# Altium footprint library Phoenix.PcbLib: 25 footprints (part 1 of 2)
Each footprint in its own frame and in the unit in brackets; x right, y up, seen from the top. Pads: shape width x height; smd on the part's side, far side on the other; paste and mask are expansions set on the pad; w line width, h text height; cw(c..) or ccw(c..) is an arc to the next point about the centre after c.
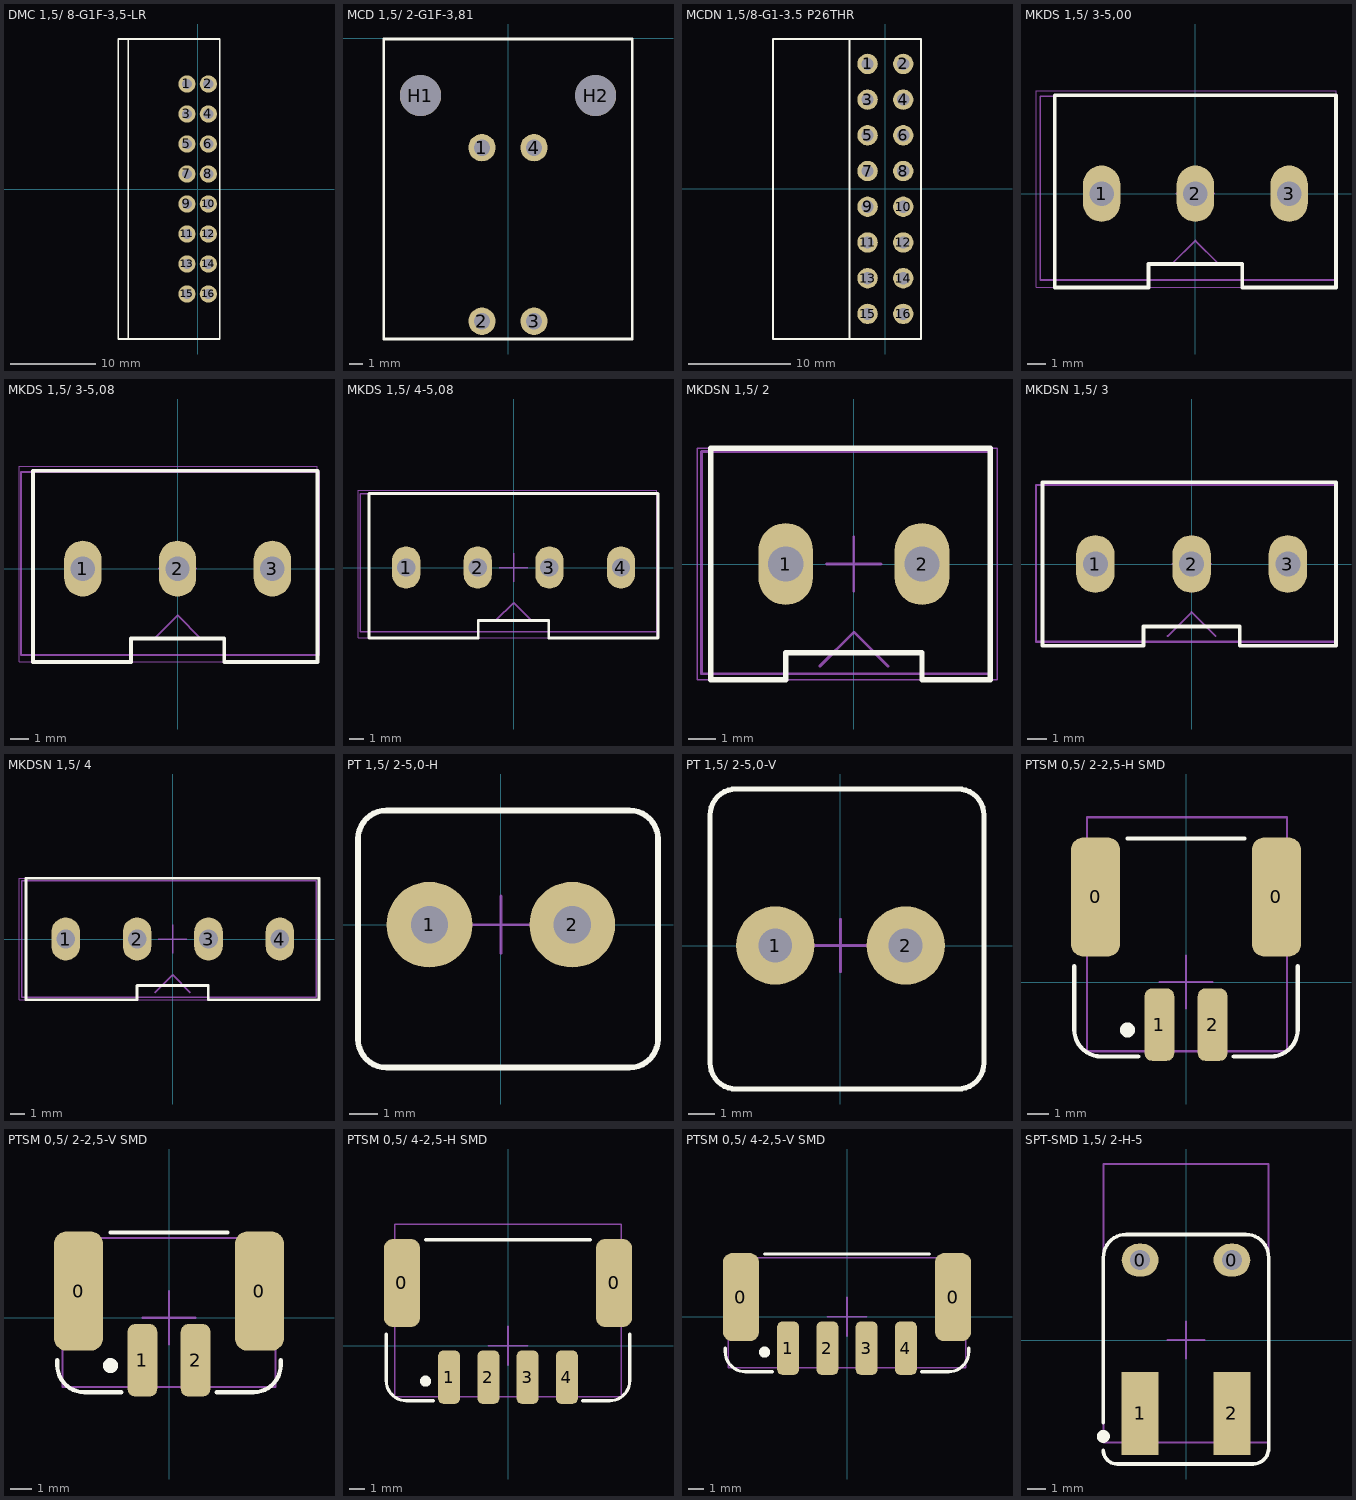
[diagram p0: the footprints below, top view; thin cyan lines are the x and y axes]

## DMC 1,5/ 8-G1F-3,5-LR [mm]
pads (16):
  round 2 hole 1.2: 1(-1.25,12.25) 2(1.25,12.25) 3(-1.25,8.75) 4(1.25,8.75) 5(-1.25,5.25) 6(1.25,5.25) 7(-1.25,1.75) 8(1.25,1.75) 9(-1.25,-1.75) 10(1.25,-1.75) 11(-1.25,-5.25) 12(1.25,-5.25) 13(-1.25,-8.75) 14(1.25,-8.75) 15(-1.25,-12.25) 16(1.25,-12.25)
Top Overlay:
  lines w0.2: -3.5,-17.5 -9.275,-17.5 -9.275,17.5 -8.075,17.5 ; -8.075,17.5 2.6,17.5 2.6,-17.5 -8.075,-17.5 -8.075,17.5
3D body "1787072.stp": height 10.8, standoff -2, extent -9.275,-17.5 2.325,17.5

## MCD 1,5/ 2-G1F-3,81 [mm] "THT Socket, Double Row, Right Angled, 2x2-Lead, Pitch 3.81"
height 22.7
pads (6):
  round 2 hole 1.2: 1(-1.905,-8) 2(-1.905,-20.7) 3(1.905,-20.7) 4(1.905,-8)
  round 3 hole 3: H1(-6.405,-4.19) H2(6.409,-4.19)
Top Overlay:
  lines w0.2: -9.1,-22 -9.1,-0.051 9.1,-0.051 9.1,-22 -9.1,-22
3D body "phoenixcontacts_1842911.stp": height 22.71, standoff -3.49, extent -9.005,-21.9 9.005,0

## MCDN 1,5/8-G1-3.5 P26THR [mm] "THT Socket, Double Row, Right Angled, 2x8-Lead, Pitch 3.5"
pads (16):
  round 2 hole 1.2: 1(-1.75,12.25) 2(1.75,12.25) 3(-1.75,8.75) 4(1.75,8.75) 5(-1.75,5.25) 6(1.75,5.25) 7(-1.75,1.75) 8(1.75,1.75) 9(-1.75,-1.75) 10(1.75,-1.75) 11(-1.75,-5.25) 12(1.75,-5.25) 13(-1.75,-8.75) 14(1.75,-8.75) 15(-1.75,-12.25) 16(1.75,-12.25)
Top Overlay:
  lines w0.2: -3.5,-14.696 3.5,-14.696 3.5,14.692 -3.5,14.692 ; -3.5,14.692 -3.5,-14.712 -11.032,-14.712 -11.032,14.692 -3.5,14.692
3D body "1953978.stp": height 15.28, standoff -1.32, extent -11.032,-14.712 2.368,14.688

## MKDS 1,5/ 3-5,00 [mm] "PCB Terminal, THT, Screw Wire Connection, Right Angled, 1x3-Lead, Pitch 5"
pads (3):
  oval 2x3 hole 1.3: 1(-5,0) 2(0,0) 3(5,0)
Top Overlay:
  lines w0.2: -7.5,-5 -2.5,-5 -2.5,-3.75 2.5,-3.75 2.5,-5 7.5,-5 7.5,5.25 -7.5,5.25 -7.5,-5
Mechanical 13:
  lines w0.1: -8.271,-4.6 7.47,-4.6 7.47,5.2 -8.271,5.2 -8.271,-4.6
Mechanical 15:
  lines w0.05: -8.5,-5 7.5,-5 7.5,5.5 -8.5,5.5 -8.5,-5
  lines w0.1: -1.25,-3.75 0,-2.5 1.25,-3.75 ; -1,0 1,0 ; 0,-1 0,1
3D body "1715035_03.stp": height 13.8, standoff -3.5, extent -8.271,-4.6 7.47,5.2

## MKDS 1,5/ 3-5,08 [mm] "PCB Terminal, THT, Screw Wire Connection, Right Angled, 1x3-Lead, Pitch 5.08"
pads (3):
  oval 2x3 hole 1.3: 1(-5.08,0) 2(0,0) 3(5.08,0)
Top Overlay:
  lines w0.2: -7.75,-5 -2.5,-5 -2.5,-3.75 2.5,-3.75 2.5,-5 7.5,-5 7.5,5.25 -7.75,5.25 -7.75,-5
Mechanical 13:
  lines w0.1: -8.397,-4.623 -8.397,5.177 7.584,5.177 7.584,-4.623 -8.397,-4.623
Mechanical 15:
  lines w0.05: -8.5,-5 -8.5,5.5 7.5,5.5 7.5,-5 -8.5,-5
  lines w0.1: -1.25,-3.75 0,-2.5 1.25,-3.75 ; -1,0 1,0 ; 0,-1 0,1
3D body "1715734_03.stp": height 15.2, standoff -2.5, extent -8.397,-4.623 7.584,5.177

## MKDS 1,5/ 4-5,08 [mm] "PCB Terminal, THT, Screw Wire Connection, Right Angled, 1x4-Lead, Pitch 5.08"
pads (4):
  oval 2x3 hole 1.3: 1(-7.62,0) 2(-2.54,0) 3(2.54,0) 4(7.62,0)
Top Overlay:
  lines w0.2: -10.25,-5 -2.5,-5 -2.5,-3.75 2.5,-3.75 2.5,-5 10.25,-5 10.25,5.25 -10.25,5.25 -10.25,-5
Mechanical 13:
  lines w0.1: -10.886,-4.572 10.175,-4.572 10.175,5.228 -10.886,5.228 -10.886,-4.572
Mechanical 15:
  lines w0.05: -11.04,-5 10.167,-5 10.167,5.5 -11.04,5.5 -11.04,-5
  lines w0.1: -1.25,-3.75 0,-2.5 1.25,-3.75 ; -1,0 1,0 ; 0,-1 0,1
3D body "1715747_03.stp": height 14.2, standoff -3.5, extent -10.886,-4.572 10.175,5.228

## MKDSN 1,5/ 2 [mm] "PCB Terminal, THT, Screw Wire Connection, Right Angled, 1x2-Lead, Pitch 5"
pads (2):
  oval 2x3 hole 1.3: 1(-2.5,0) 2(2.5,0)
Top Overlay:
  lines w0.2: -5.25,-4.25 -2.5,-4.25 -2.5,-3.25 2.5,-3.25 2.5,-4.25 5,-4.25 5,4.25 -5.25,4.25 -5.25,-4.25
Mechanical 13:
  lines w0.1: -5.585,-4.025 -5.585,4.125 4.985,4.125 4.985,-4.025 -5.585,-4.025
Mechanical 15:
  lines w0.05: -5.75,-4.25 5.25,-4.25 5.25,4.25 -5.75,4.25 -5.75,-4.25
  lines w0.1: -1.25,-3.75 0,-2.5 1.25,-3.75 ; -1,0 1,0 ; 0,-1 0,1
3D body "1729018.stp": height 10, standoff -3.5, extent -5.585,-4.025 4.985,4.125

## MKDSN 1,5/ 3 [mm] "PCB Terminal, THT, Screw Wire Connection, Right Angled, 1x3-Lead, Pitch 5"
pads (3):
  oval 2x3 hole 1.3: 1(-5,0) 2(0,0) 3(5,0)
Top Overlay:
  lines w0.2: -7.75,-4.25 -2.5,-4.25 -2.5,-3.25 2.5,-3.25 2.5,-4.25 7.5,-4.25 7.5,4.25 -7.75,4.25 -7.75,-4.25
Mechanical 13:
  lines w0.1: -8.085,-4.05 -8.085,4.1 7.485,4.1 7.485,-4.05 -8.085,-4.05
Mechanical 15:
  lines w0.05: -8.085,-4 7.5,-4 7.5,4.1 -8.085,4.1 -8.085,-4
  lines w0.1: -1.25,-3.75 0,-2.5 1.25,-3.75 ; -1,0 1,0 ; 0,-1 0,1
3D body "1729021_06.stp": height 10, standoff -3.5, extent -8.085,-4.05 7.485,4.1

## MKDSN 1,5/ 4 [mm] "PCB Terminal, THT, Screw Wire Connection, Right Angled, 1x4-Lead, Pitch 5"
pads (4):
  oval 2x3 hole 1.3: 1(-7.485,0) 2(-2.485,0) 3(2.515,0) 4(7.515,0)
Top Overlay:
  lines w0.2: -10.25,-4.25 -2.5,-4.25 -2.5,-3.25 2.5,-3.25 2.5,-4.25 10.25,-4.25 10.25,4.25 -10.25,4.25 -10.25,-4.25
Mechanical 13:
  lines w0.1: -10.57,-4.075 -10.57,4.075 10.07,4.075 10.07,-4.075 -10.57,-4.075
Mechanical 15:
  lines w0.05: -10.75,-4.25 -10.75,4.25 10.25,4.25 10.25,-4.25 -10.75,-4.25
  lines w0.1: -1.25,-3.75 0,-2.5 1.25,-3.75 ; -1,0 1,0 ; 0,-1 0,1
3D body "1729018.stp": height 10, standoff -3.5, extent -0.5,-4.075 10.07,4.075
3D body "1729018.stp": height 10, standoff -3.5, extent -10.57,-4.075 0,4.075

## PT 1,5/ 2-5,0-H [mm] "erminal, THT, Screw Wire Connection, 1.5sqmm Wire, Right Angled, 1x2-Lead, Pitch 5"
pads (2):
  round 3 hole 1.3: 1(-2.5,0) 2(2.5,0)
Top Overlay:
  lines w0.2: 5.5,3 ccw(c4.5,3) 4.5,4 -3.9,4 -4,4 ccw(c-4,3) -5,3 -5,-4 ccw(c-4,-4) -4,-5 4.5,-5 ccw(c4.5,-4) 5.5,-4 5.5,3 ; 5.5,3 5.5,3
Mechanical 15:
  lines w0.1: -1,0 1,0 ; 0,-1 0,1
3D body "1935161.stp": height 11.4, standoff -3.5, extent -5.035,-5 5.535,4

## PT 1,5/ 2-5,0-V [mm] "Terminal, THT, Screw Wire Connection, 1.5sqmm Wire, 1x2-Lead, Pitch 5"
pads (2):
  round 3 hole 1.3: 1(-2.5,0) 2(2.5,0)
Top Overlay:
  lines w0.2: -4,6 ccw(c-4,5) -5,5 -5,-4.5 ccw(c-4,-4.5) -4,-5.5 4.5,-5.5 ccw(c4.5,-4.5) 5.5,-4.5 5.5,5 ; -4,6 -4,6 ; -4,6 4.5,6 cw(c4.5,5) 5.5,5 ; 5.5,5 5.5,5
Mechanical 15:
  lines w0.1: -1,0 1,0 ; 0,-1 0,1
3D body "1935310.stp": height 9.13, standoff -3.37, extent -5.01,-5.35 5.56,6.05

## PTSM 0,5/ 2-2,5-H SMD [mm] "PCB Terminal Block, 2 Postitions, Pitch 2.5, Horizontal"
pads (4):
  rrect50% 2.3x5.6 smd: 0(-4.25,4) 0(4.25,4)
  rrect50% 1.4x3.4 smd: 1(-1.25,-2) 2(1.25,-2)
Top Overlay:
  circle w0.5: c-2.75,-2.25 r0.1
  lines w0.2: -5.25,0.75 -5.25,-2.23 ccw(c-3.98,-2.23) -3.98,-3.5 -2.25,-3.5 ; -2.75,6.75 2.75,6.75 ; 2.25,-3.5 3.98,-3.5 ccw(c3.98,-2.23) 5.25,-2.23 5.25,0.75
Mechanical 13:
  lines w0.1: -4.65,-3.25 -4.65,7.75 4.75,7.75 4.75,-3.25 -4.65,-3.25
Mechanical 15:
  lines w0.1: -1.25,0 1.25,0 ; 0,-1.25 0,1.25
3D body "1702473_01.stp": height 5, standoff 0, extent -4.65,-3.25 4.75,7.75

## PTSM 0,5/ 2-2,5-V SMD [mm] "PCB Terminal Block, 2 Postitions, Pitch 2.5, Vertical"
pads (4):
  rrect50% 2.3x5.6 smd: 0(-4.25,1.25) 0(4.25,1.25)
  rrect50% 1.4x3.4 smd: 1(-1.25,-2) 2(1.25,-2)
Top Overlay:
  circle w0.5: c-2.75,-2.25 r0.1
  lines w0.2: -5.25,-2 -5.25,-2.23 ccw(c-3.98,-2.23) -3.98,-3.5 -2.25,-3.5 ; -2.75,4 2.75,4 ; 2.25,-3.5 3.98,-3.5 ccw(c3.98,-2.23) 5.25,-2.23 5.25,-2
Mechanical 13:
  lines w0.1: -5,-3.25 -5,3.75 5,3.75 5,-3.25 -5,-3.25
Mechanical 15:
  lines w0.1: -1.25,0 1.25,0 ; 0,-1.25 0,1.25
3D body "1771091_00.stp": height 9, standoff 0, extent -5.05,-3.25 5.05,3.75

## PTSM 0,5/ 4-2,5-H SMD [mm] "PCB Terminal Block, 4 Postitions, Pitch 2.5, Horizontal"
pads (6):
  rrect50% 2.3x5.6 smd: 0(-6.75,4) 0(6.75,4)
  rrect50% 1.4x3.4 smd: 1(-3.75,-2) 2(-1.25,-2) 3(1.25,-2) 4(3.75,-2)
Top Overlay:
  circle w0.5: c-5.25,-2.25 r0.1
  lines w0.2: -7.75,0.75 -7.75,-2.23 ccw(c-6.48,-2.23) -6.48,-3.5 -4.75,-3.5 ; -5.25,6.75 5.25,6.75 ; 4.75,-3.5 6.48,-3.5 ccw(c6.48,-2.23) 7.75,-2.23 7.75,0.75
Mechanical 13:
  lines w0.1: -7.2,-3.25 7.2,-3.25 7.2,7.75 -7.2,7.75 -7.2,-3.25
Mechanical 15:
  lines w0.1: -1.25,0 1.25,0 ; 0,-1.25 0,1.25
3D body "1702474_00.stp": height 5, standoff 0, extent -7.2,-3.25 7.2,7.75

## PTSM 0,5/ 4-2,5-V SMD [mm] "PCB Terminal Block, 4 Postitions, Pitch 2.5, Vertical"
pads (6):
  rrect50% 2.3x5.6 smd: 0(-6.75,1.25) 0(6.75,1.25)
  rrect50% 1.4x3.4 smd: 1(-3.75,-2) 2(-1.25,-2) 3(1.25,-2) 4(3.75,-2)
Top Overlay:
  circle w0.5: c-5.25,-2.25 r0.1
  lines w0.2: -7.75,-2 -7.75,-2.23 ccw(c-6.48,-2.23) -6.48,-3.5 -4.75,-3.5 ; -5.25,4 5.25,4 ; 4.75,-3.5 6.48,-3.5 ccw(c6.48,-2.23) 7.75,-2.23 7.75,-2
Mechanical 13:
  lines w0.1: -7.55,-3.25 -7.55,3.75 7.55,3.75 7.55,-3.25 -7.55,-3.25
Mechanical 15:
  lines w0.1: -1.25,0 1.25,0 ; 0,-1.25 0,1.25
3D body "1771114_00.stp": height 9, standoff 0, extent -7.55,-3.25 7.55,3.75

## SPT-SMD 1,5/ 2-H-5 [mm] "PCB Terminal Block, 2 Position, Pitch 5, Horizontal"
pads (4):
  oval 2x1.8 hole 1.1 unplated: 0(-2.5,4.35) 0(2.5,4.35)
  rect 2x4.5 smd: 1(-2.5,-4) 2(2.5,-4)
Top Overlay:
  circle w0.5: c-4.5,-5.25 r0.1
  lines w0.2: -4.5,-6 ccw(c-3.75,-6) -3.75,-6.75 3.646,-6.75 ccw(c3.646,-5.896) 4.5,-5.896 4.5,4.5 ccw(c3.25,4.5) 3.25,5.75 -3.25,5.75 ccw(c-3.25,4.5) -4.5,4.5 -4.5,-4.5
Mechanical 13:
  lines w0.1: -4.5,-5.585 4.5,-5.585 4.5,9.585 -4.5,9.585 -4.5,-5.585
Mechanical 15:
  lines w0.1: -1,0 1,0 ; 0,-1 0,1
3D body "pxc_1824747_02_SPT-SMD-1-5-2-H-5-0-R24_3D.stp": height 7.7, standoff -2, extent -4.52,-4.9 4.52,9.569